# Altium integrated library LEMO Unipole And Multipole Type Connectors.IntLib: 1566 symbols (part 4 of 13) (continued)
## EEP.2E.308.CLN (continued)
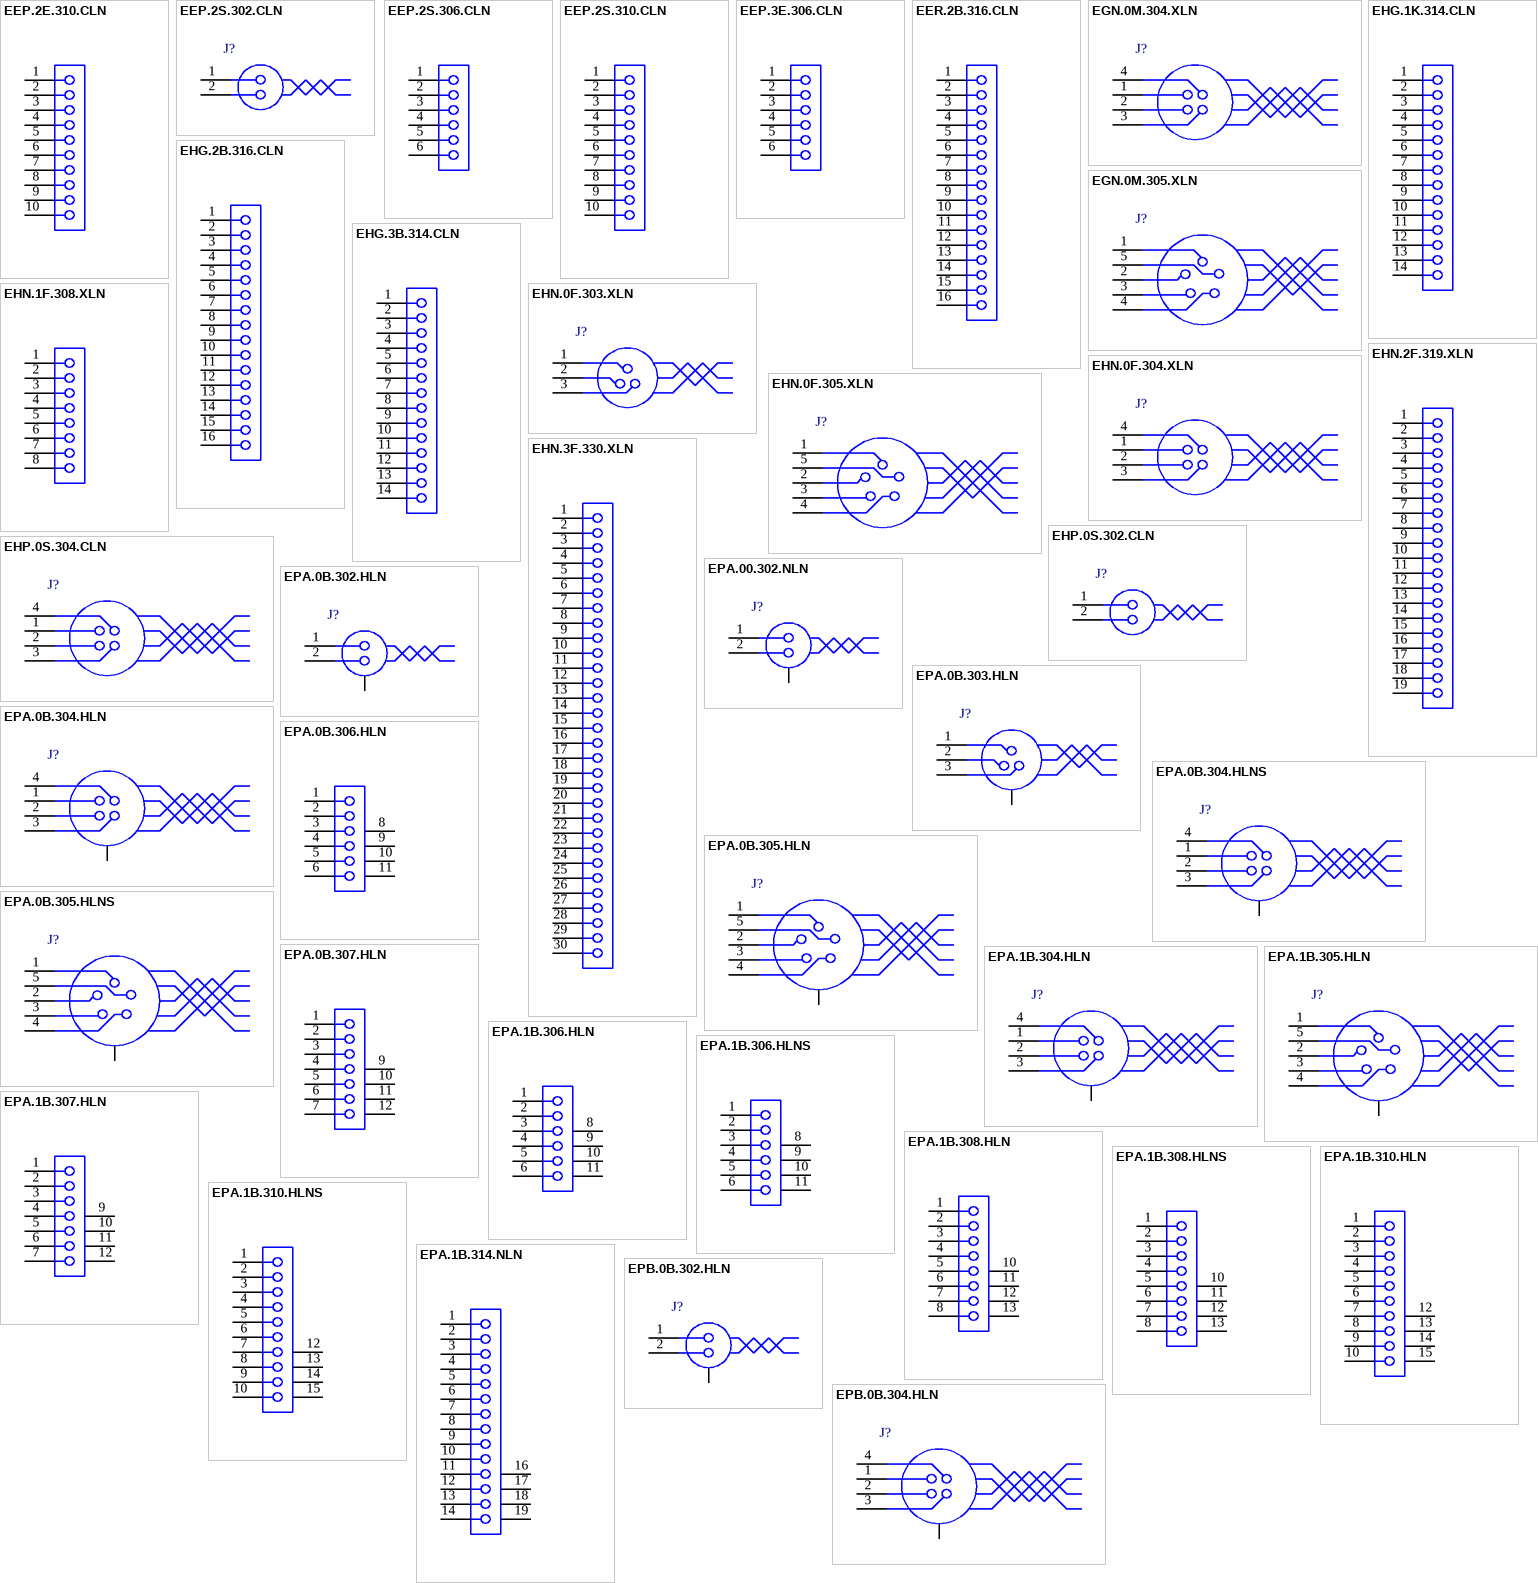
[diagram p12: symbols EEP.2E.310.CLN to EPB.0B.304.HLN]

## EEP.2E.310.CLN
designator J?
Fixed receptacle, nut fixing (back panel mounting), Key (P), 2E series, Multipole Type with 10 Contacts; Manufacturer: LEMO; PartNumber: EEP.2E.310.CLN; Number of contacts: 10; Contact Diameter: 0.9 mm; AWG: 22; Rated Current(A): 7; DatasheetVersion: Jun-14; PackageReference: EEP.2E.310.CLN; PackageDescription: Fixed receptacle, nut fixing (back panel mounting), Key(P) for Printed Circuit; ComponentLink1Description: Manufacturer URL; ComponentLink1URL: http://www.lemo.com; ComponentLink2Description: Datasheet; ComponentLink2URL: http://intra.lemo.ch/catalog/ROW/UK_English/unipole_multipole.pdf
footprint EEP.2E.310.CLN (Socket, Female, Body 20mm dia., Through hole)
pins: 1, 2, 3, 4, 5, 6, 7, 8, 9, 10

## EEP.2S.302.CLN
designator J?
Fixed receptacle, nut fixing (back panel mounting), 2S series, Multipole Type with 2 Contacts; Manufacturer: LEMO; PartNumber: EEP.2S.302.CLN; Number of contacts: 2; AWG: 16; Rated Current(A): 20; DatasheetVersion: Jun-14; PackageReference: EEP.2S.302.CLN; PackageDescription: Fixed receptacle, nut fixing (back panel mounting),  for Printed Circuit; ComponentLink1Description: Manufacturer URL; ComponentLink1URL: http://www.lemo.com; ComponentLink2Description: Datasheet; ComponentLink2URL: http://intra.lemo.ch/catalog/ROW/UK_English/unipole_multipole.pdf
footprint EEP.2S.302.CLN (Socket, Female, Body 15mm dia., Through hole)
pins: 1, 2

## EEP.2S.306.CLN
designator J?
Fixed receptacle, nut fixing (back panel mounting), 2S series, Multipole Type with 6 Contacts; Manufacturer: LEMO; PartNumber: EEP.2S.306.CLN; Number of contacts: 6; Contact Diameter: 1.3 mm; AWG: 20; Rated Current(A): 12; DatasheetVersion: Jun-14; PackageReference: EEP.2S.306.CLN; PackageDescription: Fixed receptacle, nut fixing (back panel mounting),  for Printed Circuit; ComponentLink1Description: Manufacturer URL; ComponentLink1URL: http://www.lemo.com; ComponentLink2Description: Datasheet; ComponentLink2URL: http://intra.lemo.ch/catalog/ROW/UK_English/unipole_multipole.pdf
footprint EEP.2S.306.CLN (Socket, Female, Body 15mm dia., Through hole)
pins: 1, 2, 3, 4, 5, 6

## EEP.2S.310.CLN
designator J?
Fixed receptacle, nut fixing (back panel mounting), 2S series, Multipole Type with 10 Contacts; Manufacturer: LEMO; PartNumber: EEP.2S.310.CLN; Number of contacts: 10; Contact Diameter: 0.9 mm; AWG: 22; Rated Current(A): 7; DatasheetVersion: Jun-14; PackageReference: EEP.2S.310.CLN; PackageDescription: Fixed receptacle, nut fixing (back panel mounting),  for Printed Circuit; Supplier 1: Mouser; Supplier Part Number 1: 736-EEP2S310CLN; Supplier 2: Newark; Supplier Part Number 2: 35R3545; Supplier 3: Digi-Key; Supplier Part Number 3: EEP.2S.310.CLN-ND; ComponentLink1Description: Manufacturer URL; ComponentLink1URL: http://www.lemo.com; ComponentLink2Description: Datasheet; ComponentLink2URL: http://intra.lemo.ch/catalog/ROW/UK_English/unipole_multipole.pdf
footprint EEP.2S.310.CLN (Socket, Female, Body 15mm dia., Through hole)
pins: 1, 2, 3, 4, 5, 6, 7, 8, 9, 10

## EEP.3E.306.CLN
designator J?
Fixed receptacle, nut fixing (back panel mounting), Key (P), 3E series, Multipole Type with 6 Contacts; Manufacturer: LEMO; PartNumber: EEP.3E.306.CLN; Number of contacts: 6; Contact Diameter: 1.3 mm; AWG: 20; Rated Current(A): 14; DatasheetVersion: Jun-14; PackageReference: EEP.3E.306.CLN; PackageDescription: Fixed receptacle, nut fixing (back panel mounting), Key(P) for Printed Circuit; ComponentLink1Description: Manufacturer URL; ComponentLink1URL: http://www.lemo.com; ComponentLink2Description: Datasheet; ComponentLink2URL: http://intra.lemo.ch/catalog/ROW/UK_English/unipole_multipole.pdf
footprint EEP.3E.306.CLN (Socket, Female, Through hole)
pins: 1, 2, 3, 4, 5, 6

## EER.2B.316.CLN
designator J?
Fixed receptacle, nut fixing with straight contacts for printed circuit(back panel mounting), Key (R), 2B series, Multipole Type with 16 Contacts; Manufacturer: LEMO; PartNumber: EER.2B.316.CLN; Number of contacts: 16; Contact Diameter: 0.7 mm; AWG: 24; Rated Current(A): 6; DatasheetVersion: Jun-14; PackageReference: EER.2B.316.CLN; PackageDescription: Fixed receptacle, nut fixing with straight contacts for printed circuit(back panel mounting), Key(R) for Printed Circuit; Supplier 1: Mouser; Supplier Part Number 1: 736-EER2B316CLN; Supplier 2: Digi-Key; Supplier Part Number 2: EER.2B.316.CLN-ND; ComponentLink1Description: Manufacturer URL; ComponentLink1URL: http://www.lemo.com; ComponentLink2Description: Datasheet; ComponentLink2URL: http://intra.lemo.ch/catalog/ROW/UK_English/unipole_multipole.pdf
footprint EER.2B.316.CLN (Socket, Female, Body 15mm dia. Height 24.6 mm, Through hole)
pins: 1, 2, 3, 4, 5, 6, 7, 8, 9, 10, 11, 12, 13, 14, 15, 16

## EGN.0M.304.XLN
designator J?
Fixed receptacle, nut fixing, Key (N), 0M series, Multipole Type with 4 Contacts; Manufacturer: LEMO; PartNumber: EGN.0M.304.XLN; Number of contacts: 4; Contact Diameter: 0.7 mm; AWG: 24; Rated Current(A): 7; DatasheetVersion: Jun-14; PackageReference: EGN.0M.304.XLN; PackageDescription: Fixed receptacle, nut fixing, Key(N) for Printed Circuit; ComponentLink1Description: Manufacturer URL; ComponentLink1URL: http://www.lemo.com; ComponentLink2Description: Datasheet; ComponentLink2URL: http://intra.lemo.ch/catalog/ROW/UK_English/M_series.pdf
footprint EGN.0M.304.XLN (Socket, Female, Body 9mm dia., Through hole)
pins: 1, 2, 3, 4

## EGN.0M.305.XLN
designator J?
Fixed receptacle, nut fixing, Key (N), 0M series, Multipole Type with 5 Contacts; Manufacturer: LEMO; PartNumber: EGN.0M.305.XLN; Number of contacts: 5; Contact Diameter: 0.7 mm; AWG: 24; Rated Current(A): 6.5; DatasheetVersion: Jun-14; PackageReference: EGN.0M.305.XLN; PackageDescription: Fixed receptacle, nut fixing, Key(N) for Printed Circuit; ComponentLink1Description: Manufacturer URL; ComponentLink1URL: http://www.lemo.com; ComponentLink2Description: Datasheet; ComponentLink2URL: http://intra.lemo.ch/catalog/ROW/UK_English/M_series.pdf
footprint EGN.0M.305.XLN (Socket, Female, Body 9mm dia., Through hole)
pins: 1, 2, 3, 4, 5

## EHG.1K.314.CLN
designator J?
Fixed receptacle, nut fixing and protruding shell, Key (G), 1K series, Multipole Type with 14 Contacts; Manufacturer: LEMO; PartNumber: EHG.1K.314.CLN; Number of contacts: 14; Contact Diameter: 0.5 mm; AWG: 28; Rated Current(A): 2; DatasheetVersion: Jun-14; PackageReference: EHG.1K.314.CLN; PackageDescription: Fixed receptacle, nut fixing and protruding shell, Key(G) for Printed Circuit; ComponentLink1Description: Manufacturer URL; ComponentLink1URL: http://www.lemo.com; ComponentLink2Description: Datasheet; ComponentLink2URL: http://intra.lemo.ch/catalog/ROW/UK_English/unipole_multipole.pdf
footprint EHG.1K.314.CLN (Socket, Female, Body 16mm dia. Height 25.1 mm, Through hole)
pins: 1, 2, 3, 4, 5, 6, 7, 8, 9, 10, 11, 12, 13, 14

## EHG.2B.316.CLN
designator J?
Fixed receptacle, nut fixing and protruding shell, Key (G), 2B series, Multipole Type with 16 Contacts; Manufacturer: LEMO; PartNumber: EHG.2B.316.CLN; Number of contacts: 16; Contact Diameter: 0.7 mm; AWG: 24; Rated Current(A): 6; DatasheetVersion: Jun-14; PackageReference: EHG.2B.316.CLN; PackageDescription: Fixed receptacle, nut fixing and protruding shell, Key(G) for Printed Circuit; Supplier 1: Mouser; Supplier Part Number 1: 736-EHG2B316CLN; Supplier 2: Digi-Key; Supplier Part Number 2: EHG.2B.316.CLN-ND; ComponentLink1Description: Manufacturer URL; ComponentLink1URL: http://www.lemo.com; ComponentLink2Description: Datasheet; ComponentLink2URL: http://intra.lemo.ch/catalog/ROW/UK_English/unipole_multipole.pdf
footprint EHG.2B.316.CLN (Socket, Female, Body 15mm dia. Height 24.6 mm, Through hole)
pins: 1, 2, 3, 4, 5, 6, 7, 8, 9, 10, 11, 12, 13, 14, 15, 16

## EHG.3B.314.CLN
designator J?
Fixed receptacle, nut fixing and protruding shell, Key (G), 3B series, Multipole Type with 14 Contacts; Manufacturer: LEMO; PartNumber: EHG.3B.314.CLN; Number of contacts: 14; Contact Diameter: 0.9 mm; AWG: 22; Rated Current(A): 9; DatasheetVersion: Jun-14; PackageReference: EHG.3B.314.CLN; PackageDescription: Fixed receptacle, nut fixing and protruding shell, Key(G) for Printed Circuit; ComponentLink1Description: Manufacturer URL; ComponentLink1URL: http://www.lemo.com; ComponentLink2Description: Datasheet; ComponentLink2URL: http://intra.lemo.ch/catalog/ROW/UK_English/unipole_multipole.pdf
footprint EHG.3B.314.CLN (Socket, Female, Body 18mm dia. Height 30.3 mm, Through hole)
pins: 1, 2, 3, 4, 5, 6, 7, 8, 9, 10, 11, 12, 13, 14

## EHN.0F.303.XLN
designator J?
Fixed receptacle, nut fixing (back panel mounting, printed circuit mounting possible), Key (N), 0F series, Multipole Type with 3 Contacts; Manufacturer: LEMO; PartNumber: EHN.0F.303.XLN; Number of contacts: 3; Contact Diameter: 0.9 mm; AWG: 22; Test voltage Contact-Contact(Kv rms): 1.7; Test voltage Contact-Shell(Kv rms): 1.6; Rate Current(A): 8; DatasheetVersion: Jun-14; PackageReference: EHN.0F.303.XLN; PackageDescription: Fixed receptacle, nut fixing (back panel mounting, printed circuit mounting possible), Key(N) for Printed Circuit; Supplier 1: Mouser; Supplier Part Number 1: 736-EHN0F303XLN; Supplier 2: Digi-Key; Supplier Part Number 2: EHN.0F.303.XLN-ND; ComponentLink1Description: Manufacturer URL; ComponentLink1URL: http://www.lemo.com; ComponentLink2Description: Datasheet; ComponentLink2URL: http://intra.lemo.ch/catalog/ROW/UK_English/f_series.pdf
footprint EHN.0F.303.XLN (Socket, Female, Body 10mm dia., Through hole)
pins: 1, 2, 3

## EHN.0F.304.XLN
designator J?
Fixed receptacle, nut fixing (back panel mounting, printed circuit mounting possible), Key (N), 0F series, Multipole Type with 4 Contacts; Manufacturer: LEMO; PartNumber: EHN.0F.304.XLN; Number of contacts: 4; Contact Diameter: 0.7 mm; AWG: 24; Test voltage Contact-Contact(Kv rms): 1.35; Test voltage Contact-Shell(Kv rms): 1.1; Rate Current(A): 7; DatasheetVersion: Jun-14; PackageReference: EHN.0F.304.XLN; PackageDescription: Fixed receptacle, nut fixing (back panel mounting, printed circuit mounting possible), Key(N) for Printed Circuit; Supplier 1: Mouser; Supplier Part Number 1: 736-EHN0F304XLN; Supplier 2: Digi-Key; Supplier Part Number 2: EHN.0F.304.XLN-ND; ComponentLink1Description: Manufacturer URL; ComponentLink1URL: http://www.lemo.com; ComponentLink2Description: Datasheet; ComponentLink2URL: http://intra.lemo.ch/catalog/ROW/UK_English/f_series.pdf
footprint EHN.0F.304.XLN (Socket, Female, Body 10mm dia., Through hole)
pins: 1, 2, 3, 4

## EHN.0F.305.XLN
designator J?
Fixed receptacle, nut fixing (back panel mounting, printed circuit mounting possible), Key (N), 0F series, Multipole Type with 5 Contacts; Manufacturer: LEMO; PartNumber: EHN.0F.305.XLN; Number of contacts: 5; Contact Diameter: 0.7 mm; AWG: 24; Test voltage Contact-Contact(Kv rms): 1.25; Test voltage Contact-Shell(Kv rms): 1.2; Rate Current(A): 6.5; DatasheetVersion: Jun-14; PackageReference: EHN.0F.305.XLN; PackageDescription: Fixed receptacle, nut fixing (back panel mounting, printed circuit mounting possible), Key(N) for Printed Circuit; Supplier 1: Mouser; Supplier Part Number 1: 736-EHN0F305XLN; Supplier 2: Digi-Key; Supplier Part Number 2: EHN.0F.305.XLN-ND; ComponentLink1Description: Manufacturer URL; ComponentLink1URL: http://www.lemo.com; ComponentLink2Description: Datasheet; ComponentLink2URL: http://intra.lemo.ch/catalog/ROW/UK_English/f_series.pdf
footprint EHN.0F.305.XLN (Socket, Female, Body 10mm dia., Through hole)
pins: 1, 2, 3, 4, 5

## EHN.1F.308.XLN
designator J?
Fixed receptacle, nut fixing (back panel mounting, printed circuit mounting possible), Key (N), 1F series, Multipole Type with 8 Contacts; Manufacturer: LEMO; PartNumber: EHN.1F.308.XLN; Number of contacts: 8; Contact Diameter: 0.7 mm; AWG: 24; Test voltage Contact-Contact(Kv rms): 1.3; Rate Current(A): 5; DatasheetVersion: Jun-14; PackageReference: EHN.1F.308.XLN; PackageDescription: Fixed receptacle, nut fixing (back panel mounting, printed circuit mounting possible), Key(N) for Printed Circuit; Test voltage Contact-Shell(Kv rms): 1.3; ComponentLink1Description: Manufacturer URL; ComponentLink1URL: http://www.lemo.com; ComponentLink2Description: Datasheet; ComponentLink2URL: http://intra.lemo.ch/catalog/ROW/UK_English/f_series.pdf
footprint EHN.1F.308.XLN (Socket, Female, Body 13mm dia., Through hole)
pins: 1, 2, 3, 4, 5, 6, 7, 8

## EHN.2F.319.XLN
designator J?
Fixed receptacle, nut fixing (back panel mounting, printed circuit mounting possible), Key (N), 2F series, Multipole Type with 19 Contacts; Manufacturer: LEMO; PartNumber: EHN.2F.319.XLN; Number of contacts: 19; Contact Diameter: 0.7 mm; AWG: 24; Test voltage Contact-Contact(Kv rms): 1.55; Test voltage Contact-Shell(Kv rms): 1.65; Rate Current(A): 5; DatasheetVersion: Jun-14; PackageReference: EHN.2F.319.XLN; PackageDescription: Fixed receptacle, nut fixing (back panel mounting, printed circuit mounting possible), Key(N) for Printed Circuit; ComponentLink1Description: Manufacturer URL; ComponentLink1URL: http://www.lemo.com; ComponentLink2Description: Datasheet; ComponentLink2URL: http://intra.lemo.ch/catalog/ROW/UK_English/f_series.pdf
footprint EHN.2F.319.XLN (Socket, Female, Body 16mm dia., Through hole)
pins: 1, 2, 3, 4, 5, 6, 7, 8, 9, 10, 11, 12, 13, 14, 15, 16, 17, 18, 19

## EHN.3F.330.XLN
designator J?
Fixed receptacle, nut fixing (back panel mounting, printed circuit mounting possible), Key (N), 3F series, Multipole Type with 30 Contacts; Manufacturer: LEMO; PartNumber: EHN.3F.330.XLN; Number of contacts: 30; Contact Diameter: 0.7 mm; AWG: 24; Test voltage Contact-Contact(Kv rms): 1.35; Test voltage Contact-Shell(Kv rms): 1.2; Rate Current(A): 3.5; DatasheetVersion: Jun-14; PackageReference: EHN.3F.330.XLN; PackageDescription: Fixed receptacle, nut fixing (back panel mounting, printed circuit mounting possible), Key(N) for Printed Circuit; Supplier 1: Mouser; Supplier Part Number 1: 736-EHN3F330XLN; Supplier 2: Digi-Key; Supplier Part Number 2: EHN.3F.330.XLN-ND; ComponentLink1Description: Manufacturer URL; ComponentLink1URL: http://www.lemo.com; ComponentLink2Description: Datasheet; ComponentLink2URL: http://intra.lemo.ch/catalog/ROW/UK_English/f_series.pdf
footprint EHN.3F.330.XLN (Socket, Female, Body 18mm dia., Through hole)
pins: 1, 2, 3, 4, 5, 6, 7, 8, 9, 10, 11, 12, 13, 14, 15, 16, 17, 18, 19, 20, 21, 22, 23, 24, 25, 26, 27, 28, 29, 30

## EHP.0S.302.CLN
designator J?
Fixed receptacle, nut fixing, protruding shell, 0S series, Multipole Type with 2 Contacts; Manufacturer: LEMO; PartNumber: EHP.0S.302.CLN; Number of contacts: 2; Contact Diameter: 0.9 mm; AWG: 22; Rated Current(A): 10; DatasheetVersion: Jun-14; PackageReference: EHP.0S.302.CLN; PackageDescription: Fixed receptacle, nut fixing, protruding shell,  for Printed Circuit; ComponentLink1Description: Manufacturer URL; ComponentLink1URL: http://www.lemo.com; ComponentLink2Description: Datasheet; ComponentLink2URL: http://intra.lemo.ch/catalog/ROW/UK_English/unipole_multipole.pdf
footprint EHP.0S.302.CLN (Socket, Female, Body 9mm dia., Through hole)
pins: 1, 2

## EHP.0S.304.CLN
designator J?
Fixed receptacle, nut fixing, protruding shell, 0S series, Multipole Type with 4 Contacts; Manufacturer: LEMO; PartNumber: EHP.0S.304.CLN; Number of contacts: 4; Contact Diameter: 0.7 mm; AWG: 24; Rated Current(A): 7; DatasheetVersion: Jun-14; PackageReference: EHP.0S.304.CLN; PackageDescription: Fixed receptacle, nut fixing, protruding shell,  for Printed Circuit; ComponentLink1Description: Manufacturer URL; ComponentLink1URL: http://www.lemo.com; ComponentLink2Description: Datasheet; ComponentLink2URL: http://intra.lemo.ch/catalog/ROW/UK_English/unipole_multipole.pdf
footprint EHP.0S.304.CLN (Socket, Female, Body 9mm dia., Through hole)
pins: 1, 2, 3, 4

## EPA.00.302.NLN
designator J?
Elbow receptacle for printed circuit, Key (A), 00 series, Multipole Type with 2 Contacts; Manufacturer: LEMO; PartNumber: EPA.00.302.NLN; Number of contacts: 2; Contact Diameter: 0.5 mm; AWG: 28; DatasheetVersion: Jun-14; PackageReference: EPA.00.302.NLN; PackageDescription: Elbow receptacle for printed circuit, Key(A) for Printed Circuit; Rated Current(A): 2; ComponentLink1Description: Manufacturer URL; ComponentLink1URL: http://www.lemo.com; ComponentLink2Description: Datasheet; ComponentLink2URL: http://intra.lemo.ch/catalog/ROW/UK_English/unipole_multipole.pdf
footprint EPA.00.302.NLN (Socket, Female, Height 7.1 mm, Through hole)
pins: 1, 2, 4, 5, 6, 7

## EPA.0B.302.HLN
designator J?
Elbow receptacle for printed circuit (solder or screw fixing), Key (A), 0B series, Multipole Type with 2 Contacts; Manufacturer: LEMO; PartNumber: EPA.0B.302.HLN; Number of contacts: 2; Contact Diameter: 0.9 mm; AWG: 22; Rated Current(A): 6; DatasheetVersion: Jun-14; PackageReference: EPA.0B.302.HLN; PackageDescription: Elbow receptacle for printed circuit (solder or screw fixing), Key(A) for Printed Circuit; Supplier 1: Mouser; Supplier Part Number 1: 736-EPA0B302HLN; Supplier 2: Digi-Key; Supplier Part Number 2: EPA.0B.302.HLN-ND; ComponentLink1Description: Manufacturer URL; ComponentLink1URL: http://www.lemo.com; ComponentLink2Description: Datasheet; ComponentLink2URL: http://intra.lemo.ch/catalog/ROW/UK_English/unipole_multipole.pdf
footprint EPA.0B.302.HLN (Socket, Female, Height 11.7 mm, Through hole)
pins: 1, 2, 4, 5, 6, 7

## EPA.0B.303.HLN
designator J?
Elbow receptacle for printed circuit (solder or screw fixing), Key (A), 0B series, Multipole Type with 3 Contacts; Manufacturer: LEMO; PartNumber: EPA.0B.303.HLN; Number of contacts: 3; Contact Diameter: 0.9 mm; AWG: 22; Rated Current(A): 6; DatasheetVersion: Jun-14; PackageReference: EPA.0B.303.HLN; PackageDescription: Elbow receptacle for printed circuit (solder or screw fixing), Key(A) for Printed Circuit; ComponentLink1Description: Manufacturer URL; ComponentLink1URL: http://www.lemo.com; ComponentLink2Description: Datasheet; ComponentLink2URL: http://intra.lemo.ch/catalog/ROW/UK_English/unipole_multipole.pdf
footprint EPA.0B.303.HLN (Socket, Female, Height 11.7 mm, Through hole)
pins: 1, 2, 3, 5, 6, 7, 8

## EPA.0B.304.HLN
designator J?
Elbow receptacle for printed circuit (solder or screw fixing), Key (A), 0B series, Multipole Type with 4 Contacts; Manufacturer: LEMO; PartNumber: EPA.0B.304.HLN; Number of contacts: 4; Contact Diameter: 0.7 mm; AWG: 24; Rated Current(A): 6; DatasheetVersion: Jun-14; PackageReference: EPA.0B.304.HLN; PackageDescription: Elbow receptacle for printed circuit (solder or screw fixing), Key(A) for Printed Circuit; Supplier 1: Mouser; Supplier Part Number 1: 736-EPA0B304HLN; Supplier 2: Digi-Key; Supplier Part Number 2: EPA.0B.304.HLN-ND; ComponentLink1Description: Manufacturer URL; ComponentLink1URL: http://www.lemo.com; ComponentLink2Description: Datasheet; ComponentLink2URL: http://intra.lemo.ch/catalog/ROW/UK_English/unipole_multipole.pdf
footprint EPA.0B.304.HLN (Socket, Female, Height 11.7 mm, Through hole)
pins: 1, 2, 3, 4, 6, 7, 8, 9

## EPA.0B.304.HLNS
designator J?
Elbow receptacle for printed circuit (solder or screw fixing), Key (A), 0B series, Multipole Type with 4 Contacts; Manufacturer: LEMO; PartNumber: EPA.0B.304.HLNS; Number of contacts: 4; Contact Diameter: 0.7 mm; AWG: 24; Rated Current(A): 6; DatasheetVersion: Jun-14; PackageReference: EPA.0B.304.HLNS; PackageDescription: Elbow receptacle for printed circuit (solder or screw fixing), Key(A) for Printed Circuit; ComponentLink1Description: Manufacturer URL; ComponentLink1URL: http://www.lemo.com; ComponentLink2Description: Datasheet; ComponentLink2URL: http://intra.lemo.ch/catalog/ROW/UK_English/unipole_multipole.pdf
footprint EPA.0B.304.HLNS (Socket, Female, Height 11.7 mm, Through hole)
pins: 1, 2, 3, 4, 6, 7, 8, 9

## EPA.0B.305.HLN
designator J?
Elbow receptacle for printed circuit (solder or screw fixing), Key (A), 0B series, Multipole Type with 5 Contacts; Manufacturer: LEMO; PartNumber: EPA.0B.305.HLN; Number of contacts: 5; Contact Diameter: 0.7 mm; AWG: 24; Rated Current(A): 6; DatasheetVersion: Jun-14; PackageReference: EPA.0B.305.HLN; PackageDescription: Elbow receptacle for printed circuit (solder or screw fixing), Key(A) for Printed Circuit; ComponentLink1Description: Manufacturer URL; ComponentLink1URL: http://www.lemo.com; ComponentLink2Description: Datasheet; ComponentLink2URL: http://intra.lemo.ch/catalog/ROW/UK_English/unipole_multipole.pdf
footprint EPA.0B.305.HLN (Socket, Female, Height 11.7 mm, Through hole)
pins: 1, 2, 3, 4, 5, 7, 8, 9, 10

## EPA.0B.305.HLNS
designator J?
Elbow receptacle for printed circuit (solder or screw fixing), Key (A), 0B series, Multipole Type with 5 Contacts; Manufacturer: LEMO; PartNumber: EPA.0B.305.HLNS; Number of contacts: 5; Contact Diameter: 0.7 mm; AWG: 24; Rated Current(A): 6; DatasheetVersion: Jun-14; PackageReference: EPA.0B.305.HLNS; PackageDescription: Elbow receptacle for printed circuit (solder or screw fixing), Key(A) for Printed Circuit; ComponentLink1Description: Manufacturer URL; ComponentLink1URL: http://www.lemo.com; ComponentLink2Description: Datasheet; ComponentLink2URL: http://intra.lemo.ch/catalog/ROW/UK_English/unipole_multipole.pdf
footprint EPA.0B.305.HLNS (Socket, Female, Height 11.7 mm, Through hole)
pins: 1, 2, 3, 4, 5, 7, 8, 9, 10

## EPA.0B.306.HLN
designator J?
Elbow receptacle for printed circuit (solder or screw fixing), Key (A), 0B series, Multipole Type with 6 Contacts; Manufacturer: LEMO; PartNumber: EPA.0B.306.HLN; Number of contacts: 6; Contact Diameter: 0.5 mm; AWG: 28; Rated Current(A): 2.5.; DatasheetVersion: Jun-14; PackageReference: EPA.0B.306.HLN; PackageDescription: Elbow receptacle for printed circuit (solder or screw fixing), Key(A) for Printed Circuit; Supplier 1: Mouser; Supplier Part Number 1: 736-EPA0B306HLN; Supplier 2: Digi-Key; Supplier Part Number 2: EPA.0B.306.HLN-ND; ComponentLink1Description: Manufacturer URL; ComponentLink1URL: http://www.lemo.com; ComponentLink2Description: Datasheet; ComponentLink2URL: http://intra.lemo.ch/catalog/ROW/UK_English/unipole_multipole.pdf
footprint EPA.0B.306.HLN (Socket, Female, Height 11.7 mm, Through hole)
pins: 1, 2, 3, 4, 5, 6, 8, 9, 10, 11

## EPA.0B.307.HLN
designator J?
Elbow receptacle for printed circuit (solder or screw fixing), Key (A), 0B series, Multipole Type with 7 Contacts; Manufacturer: LEMO; PartNumber: EPA.0B.307.HLN; Number of contacts: 7; Contact Diameter: 0.5 mm; AWG: 28; Rated Current(A): 2; DatasheetVersion: Jun-14; PackageReference: EPA.0B.307.HLN; PackageDescription: Elbow receptacle for printed circuit (solder or screw fixing), Key(A) for Printed Circuit; Supplier 1: Mouser; Supplier Part Number 1: 736-EPA0B307HLN; Supplier 2: Digi-Key; Supplier Part Number 2: EPA.0B.307.HLN-ND; ComponentLink1Description: Manufacturer URL; ComponentLink1URL: http://www.lemo.com; ComponentLink2Description: Datasheet; ComponentLink2URL: http://intra.lemo.ch/catalog/ROW/UK_English/unipole_multipole.pdf
footprint EPA.0B.307.HLN (Socket, Female, Height 11.7 mm, Through hole)
pins: 1, 2, 3, 4, 5, 6, 7, 9, 10, 11, 12

## EPA.1B.304.HLN
designator J?
Elbow receptacle for printed circuit (solder or screw fixing), Key (A), 1B series, Multipole Type with 4 Contacts; Manufacturer: LEMO; PartNumber: EPA.1B.304.HLN; Number of contacts: 4; Contact Diameter: 0.9 mm; AWG: 22; Rated Current(A): 6; DatasheetVersion: Jun-14; PackageReference: EPA.1B.304.HLN; PackageDescription: Elbow receptacle for printed circuit (solder or screw fixing), Key(A) for Printed Circuit; ComponentLink1Description: Manufacturer URL; ComponentLink1URL: http://www.lemo.com; ComponentLink2Description: Datasheet; ComponentLink2URL: http://intra.lemo.ch/catalog/ROW/UK_English/unipole_multipole.pdf
footprint EPA.1B.304.HLN (Socket, Female, Height 12.6 mm, Through hole)
pins: 1, 2, 3, 4, 6, 7, 8, 9

## EPA.1B.305.HLN
designator J?
Elbow receptacle for printed circuit (solder or screw fixing), Key (A), 1B series, Multipole Type with 5 Contacts; Manufacturer: LEMO; PartNumber: EPA.1B.305.HLN; Number of contacts: 5; Contact Diameter: 0.9 mm; AWG: 22; Rated Current(A): 6; DatasheetVersion: Jun-14; PackageReference: EPA.1B.305.HLN; PackageDescription: Elbow receptacle for printed circuit (solder or screw fixing), Key(A) for Printed Circuit; Supplier 1: Mouser; Supplier Part Number 1: 736-EPA1B305HLN; Supplier 2: Digi-Key; Supplier Part Number 2: EPA.1B.305.HLN-ND; ComponentLink1Description: Manufacturer URL; ComponentLink1URL: http://www.lemo.com; ComponentLink2Description: Datasheet; ComponentLink2URL: http://intra.lemo.ch/catalog/ROW/UK_English/unipole_multipole.pdf
footprint EPA.1B.305.HLN (Socket, Female, Height 12.6 mm, Through hole)
pins: 1, 2, 3, 4, 5, 7, 8, 9, 10

## EPA.1B.306.HLN
designator J?
Elbow receptacle for printed circuit (solder or screw fixing), Key (A), 1B series, Multipole Type with 6 Contacts; Manufacturer: LEMO; PartNumber: EPA.1B.306.HLN; Number of contacts: 6; Contact Diameter: 0.7 mm; AWG: 24; DatasheetVersion: Jun-14; PackageReference: EPA.1B.306.HLN; PackageDescription: Elbow receptacle for printed circuit (solder or screw fixing), Key(A) for Printed Circuit; Rated Current(A): 6; ComponentLink1Description: Manufacturer URL; ComponentLink1URL: http://www.lemo.com; ComponentLink2Description: Datasheet; ComponentLink2URL: http://intra.lemo.ch/catalog/ROW/UK_English/unipole_multipole.pdf
footprint EPA.1B.306.HLN (Socket, Female, Height 12.6 mm, Through hole)
pins: 1, 2, 3, 4, 5, 6, 8, 9, 10, 11

## EPA.1B.306.HLNS
designator J?
Elbow receptacle for printed circuit (solder or screw fixing), Key (A), 1B series, Multipole Type with 6 Contacts; Manufacturer: LEMO; PartNumber: EPA.1B.306.HLNS; Number of contacts: 6; Contact Diameter: 0.7 mm; AWG: 24; DatasheetVersion: Jun-14; PackageReference: EPA.1B.306.HLNS; PackageDescription: Elbow receptacle for printed circuit (solder or screw fixing), Key(A) for Printed Circuit; Rated Current(A): 6; ComponentLink1Description: Manufacturer URL; ComponentLink1URL: http://www.lemo.com; ComponentLink2Description: Datasheet; ComponentLink2URL: http://intra.lemo.ch/catalog/ROW/UK_English/unipole_multipole.pdf
footprint EPA.1B.306.HLNS (Socket, Female, Height 12.6 mm, Through hole)
pins: 1, 2, 3, 4, 5, 6, 8, 9, 10, 11
